# Altium footprint library Cty1.PcbLib: 870 footprints (part 43 of 55)
Each footprint in its own frame and in the unit in brackets; x right, y up, seen from the top. Pads: shape width x height; smd on the part's side, far side on the other; paste and mask are expansions set on the pad; w line width, h text height; cw(c..) or ccw(c..) is an arc to the next point about the centre after c.
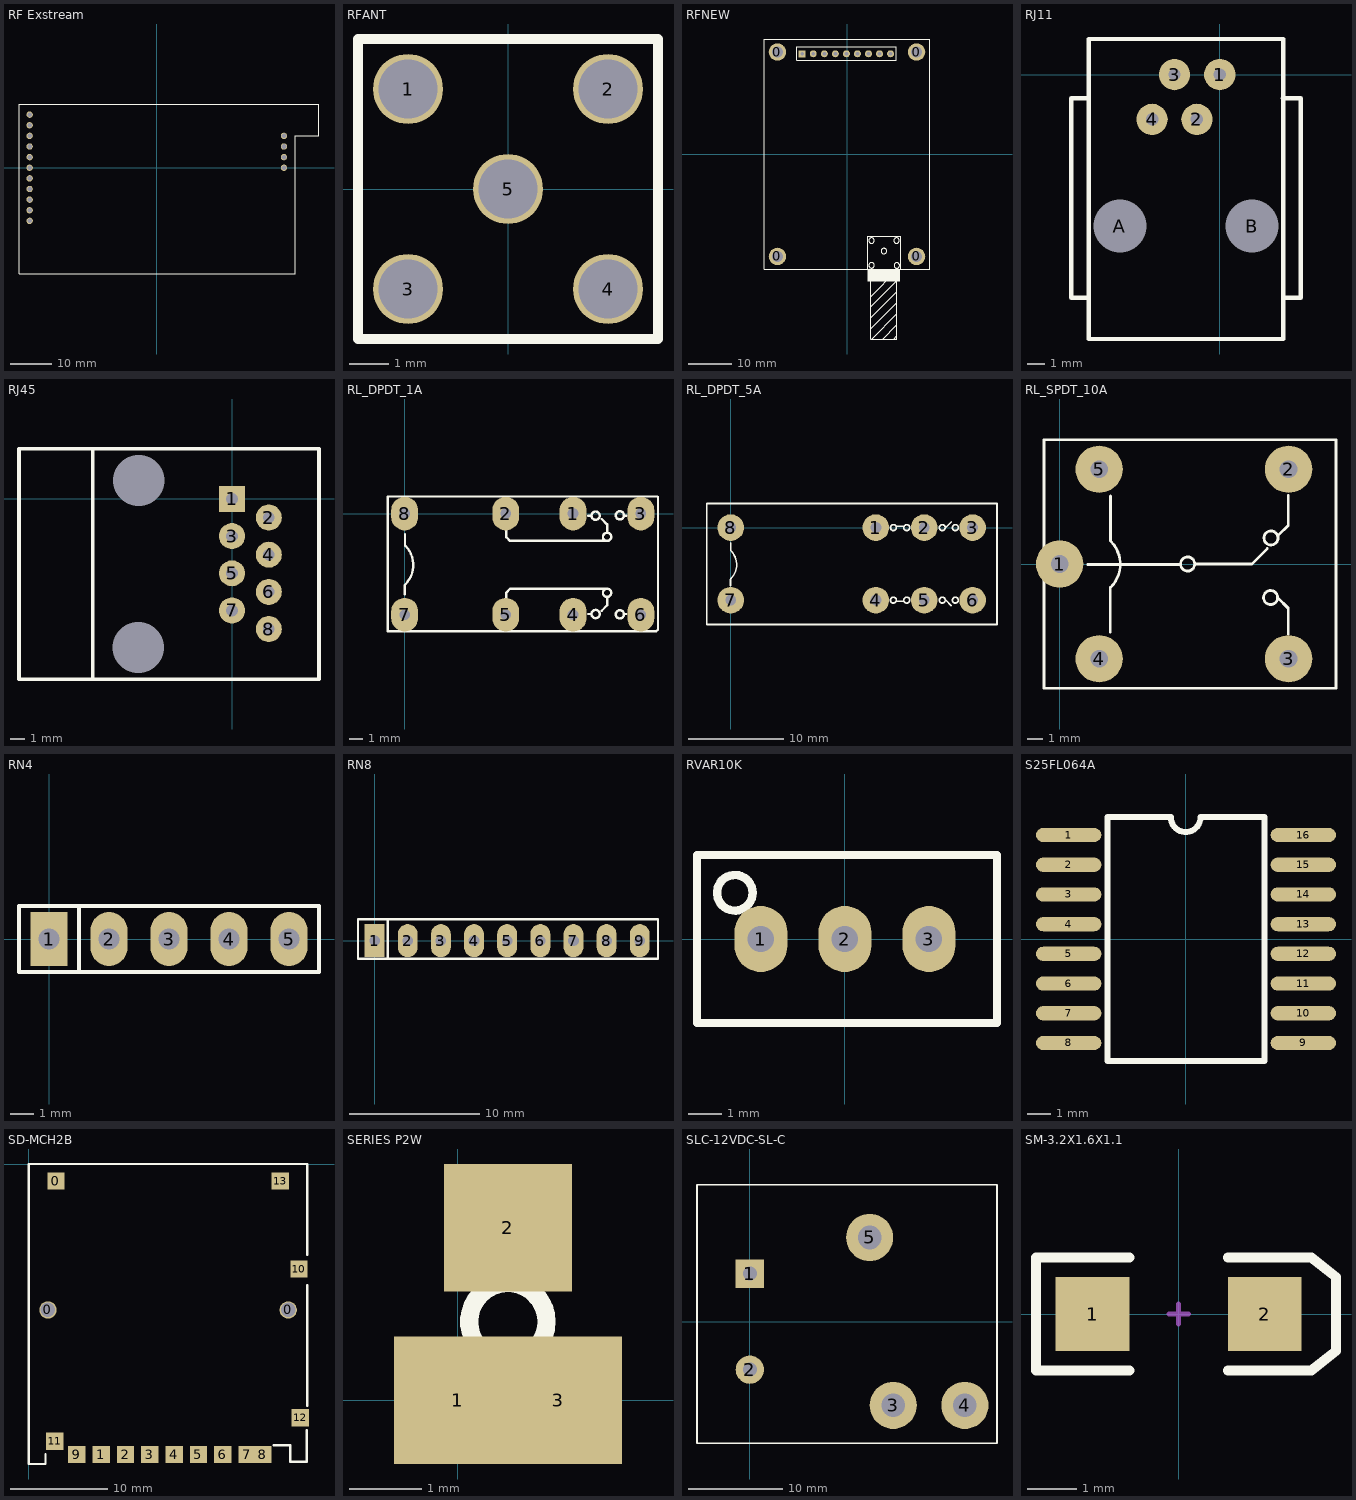
[diagram p42: the footprints below, top view; thin cyan lines are the x and y axes]

## RF Exstream [mil] "Modul RF maxstream 900MHz"
pads (15):
  round 60 hole 43.31: 1(-1197.5,500) 2(-1197.5,400) 3(-1197.5,300) 4(-1197.5,200) 5(-1197.5,100) 6(-1197.5,0) 7(-1197.5,-100) 8(-1197.5,-200) 9(-1197.5,-300) 10(-1197.5,-400) 11(-1197.5,-500) 12(1197.5,300) 13(1197.5,200) 14(1197.5,100) 15(1197.5,0)
Top Overlay:
  lines w10: -1297.5,-1000 -1297.5,600 1527.5,600 1527.5,300 1302.5,300 1302.5,-1000 -1297.5,-1000

## RFANT [mil]
pads (5):
  round 70 hole 59.06 unplated: 1(-100,100) 2(100,100) 3(-100,-100) 4(100,-100) 5(0,0)
Top Overlay:
  lines w10: -150,-150 -150,100 -150,150 150,150 150,-150 -150,-150

## RFNEW [mm] "Module RF"
height 10
pads (13):
  round 4 hole 2.5: 0(-16,-23.5) 0(-16,23.5) 0(16,-23.5) 0(16,23.5)
  rect 1.6x1.6 hole 0.9: 1(-10.3,23.1)
  round 1.6 hole 0.9: 2(-7.76,23.1) 3(-5.22,23.1) 4(-2.68,23.1) 5(-0.14,23.1) 6(2.4,23.1) 7(4.94,23.1) 8(7.48,23.1) 9(10.02,23.1)
Top Overlay:
  circle w0.254: c8.497,-22.275 r0.635
  circle w0.254: c5.652,-19.862 r0.635
  circle w0.254: c11.392,-19.862 r0.635
  circle w0.254: c11.455,-25.586 r0.635
  circle w0.254: c5.652,-25.551 r0.635
  rectangle: 4.724,-29.318 12.192,-26.492
  lines w0.2: 5.5,-40.171 11.5,-34.171 ; 5.5,-37.631 11.5,-31.631 ; 5.5,-29.091 8.04,-26.551 ; 5.506,-35.085 11.5,-29.091 ; 5.582,-32.621 11.5,-26.703 ; 5.785,-42.426 11.5,-36.711 ; 8.251,-42.5 11.5,-39.251 ; 10.791,-42.5 11.5,-41.791 ; -11.57,21.59 11.29,21.59 11.29,24.765 -11.57,24.765 -11.57,21.59
  lines w0.254: 5.5,-26.5 5.5,-42.5 11.5,-42.5 11.5,-26.5 ; -19,-26.5 19,-26.5 19,26.5 -19,26.5 -19,-26.5 ; 4.724,-26.5 4.724,-20.15 4.724,-18.88 12.344,-18.88 12.344,-26.5 4.724,-26.5

## RJ11 [mil]
pads (6):
  round 70 hole 27.56 unplated: 1(0,0) 2(-51,-100) 3(-101,0) 4(-151,-100)
  round 70 hole 118.11 unplated: A(-223,-337.7) B(72.28,-337.7)
Top Overlay:
  lines w10: -291.9,-497.7 -331.27,-497.7 -331.27,-52.7 -291.9,-52.7 ; 140,-52.7 180.54,-52.7 180.54,-497.7 141.17,-497.7 ; -291.9,-589.55 -291.9,79.3 141.17,79.3 141.17,-589.55 -291.9,-589.55

## RJ45 [mil]
pads (10):
  rect 70x70 hole 31.5 unplated: 1(0,0)
  round 70 hole 31.5 unplated: 2(99,-50) 3(0,-100) 4(99,-150) 5(0,-200) 6(99,-250) 7(0,-300) 8(99,-350)
  round 70 hole 137.8 unplated: ""(-252,-400) ""(-251,50)
Top Overlay:
  lines w10: -375,-485.04 -375,135.04 -306,135.04 ; -573.05,-485.04 -510,-485.04 -408,-485.04 50,-485.04 148,-485.04 234.04,-485.04 234.04,135.04 148.37,135.03 50,135.04 -414,135.04 -509,135.04 -573.05,135.04 -573.05,-485.04

## RL_DPDT_1A [mil] "Reley DPDT, 8 pin, 1A, W400mil, L800mil,H 300mil"
height 300
pads (8):
  oval 80x100 hole 32: 1(500,0) 2(300,0) 3(701,0) 4(500,-300) 5(300,-300) 6(701,-300) 7(0,-300) 8(0,0)
Top Overlay:
  circle w7: c638.76,-5 r12.24
  circle w7: c566.76,-6 r12.24
  circle w7: c600.76,-69 r12.24
  circle w7: c600.76,-235 r12.24
  circle w7: c566.76,-298 r12.24
  circle w7: c638.76,-299 r12.24
  lines w7: 0,-239 0,-212 ; 1,-211 ccw(c-56.5,-152.5) 2,-95 ; 1,-94 1,-61 ; 302,-255 302,-234 313,-223 599,-223 ; 302,-42 302,-70 313,-81 599,-81 ; 544,-298 552,-298 ; 544,-6 552,-6 ; 585,-288 601,-272 601,-249 ; 585,-16 601,-32 601,-55 ; 653,-298 658,-298 ; 653,-6 658,-6 ; -50,-349 747,-349 752,-344 752,49 750,51 -50,51 -50,-349
3D body "SW3dPS-DSY2Y.STEP": height 484.25, standoff -118.11, extent -59.45,-340 759.45,45.83

## RL_DPDT_5A [mil] "Reley DPDT, 8 pin, 5A, W500mil, L1100mil,H 950mil"
height 300
pads (8):
  round 110 hole 45: 1(600,0) 2(800,0) 3(1000,0) 4(600,-300) 5(800,-300) 6(1000,-300) 7(0,-300) 8(0,0)
Top Overlay:
  circle w7: c928.76,0 r12.24
  circle w7: c874.76,0 r12.24
  circle w7: c727.76,0 r12.24
  circle w7: c672.76,0 r12.24
  circle w7: c672.76,-300 r12.24
  circle w7: c727.76,-300 r12.24
  circle w7: c874.76,-300 r12.24
  circle w7: c928.76,-300 r12.24
  lines w7: -1,-240 -1,-213 ; 0,-212 ccw(c-57.5,-153.5) 1,-96 ; 0,-95 0,-62 ; 687,-305 716,-305 ; 687,5 716,5 ; 888,-299 912,-323 ; 888,-1 912,23 ; -99,-401 -99,100 1101,100 1101,-401 -99,-401

## RL_SPDT_10A [mil] "Relay SPDT, 5 pin, 10A,W 650mil, L 800mil, H 800mil"
height 800
pads (5):
  round 120 hole 45: 1(0,0) 2(580,240) 3(580,-240) 4(100,-240) 5(100,240)
Top Overlay:
  circle w7: c534.2,-85 r17.8
  circle w7: c535.2,66 r17.8
  circle w7: c324.2,0 r17.8
  lines w7: 71,-1 304,-1 ; 128,-173 128,-60 ; 129,-59 ccw(c71.5,-0.5) 130,57 ; 129,58 129,172 ; 344,0 487,0 526,39 ; 552,-85 579,-112 579,-178 ; 553,72 579,98 579,174 ; -40,-315 -40,315 700,315 700,-315 -40,-315
3D body "User Library-RELAY  12MMx12MM SQUARE-1.STEP": height 590.55, standoff -78.74, extent -98.42,-314.96 688.98,314.96

## RN4 [mil] "R SIP4, 5 Pin"
height 200
pads (5):
  rect 62x90 hole 35: 1(0,0)
  oval 62x90 hole 35: 2(100,0) 3(200,0) 4(300,0) 5(400,0)
Top Overlay:
  lines w7: 50,-55 50,55 ; -50,-55 -50,55 450,55 450,-55 -50,-55

## RN8 [mil] "R SIP8, 9 Pin"
height 200
pads (9):
  rect 60x100 hole 32: 1(0,0)
  oval 60x100 hole 32: 2(100,0) 3(200,0) 4(300,0) 5(400,0) 6(500,0) 7(600,0) 8(700,0) 9(800,0)
Top Overlay:
  lines w7: 40,-55 40,65 ; -50,-55 855,-55 855,65 -50,65 -50,-55
3D body "SW3dPS-Resistor Networks-1.STEP": height 259.29, standoff -75.35, extent -42.91,-44.21 842.91,5

## RVAR10K [mm] "Bien tro vi chinh"
pads (3):
  oval 1.6x2 hole 0.8: 1(-2.54,0) 2(0,0) 3(2.54,0)
Top Overlay:
  circle w0.254: c-3.327,1.397 r0.539
  lines w0.254: -4.47,-2.54 -4.47,2.54 4.597,2.54 4.597,-2.54 -4.47,-2.54

## S25FL064A [mil]
pads (16):
  oval 110x24 smd: 1(-197.5,175) 2(-197.5,125) 3(-197.5,75) 4(-197.5,25) 5(-197.5,-25) 6(-197.5,-75) 7(-197.5,-125) 8(-197.5,-175) 9(197.5,-175) 10(197.5,-125) 11(197.5,-75) 12(197.5,-25) 13(197.5,25) 14(197.5,75) 15(197.5,125) 16(197.5,175)
Top Overlay:
  lines w10: -132.5,-205 132.5,-205 132.5,205 24.5,205 cw(c-0.5,205) -25.5,205 -132.5,205 -132.5,-205

## SD-MCH2B [mil]
pads (16):
  round 70 hole 59.05 unplated: 0(76.77,-590.55) 0(1049.21,-590.55)
  rect 70x70 smd: 0(109.25,-68.9) 1(292.32,-1175.55) 2(390.75,-1175.55) 3(489.17,-1175.55) 4(587.6,-1175.55) 5(686.02,-1175.55) 6(784.45,-1175.55) 7(882.87,-1175.55) 8(946.85,-1175.55) 9(193.9,-1175.55) 10(1092.52,-425.2) 11(104.33,-1122.05) 12(1098.43,-1026.38) 13(1016.73,-68.9)
Top Overlay:
  lines w10: 66.93,-1174.07 66.93,-1213.98 0,-1213.98 0,-698.98 0,0 1125.98,0 1125.98,-367.54 ; 990.92,-1138.62 1057.09,-1138.62 1057.09,-1205.55 1124.02,-1205.55 1124.02,-1077.57 ; 1125.98,-978.57 1125.98,-690.55 1125.98,-490.53

## SERIES P2W [mil]
pads (3):
  rect 70x70 smd: 1(0,0) 2(27.56,94.49) 3(55.12,0)
Top Overlay:
  circle w10: c27.46,43 r21.2

## SLC-12VDC-SL-C [mm] "RELAY"
height 28
pads (5):
  rect 3x3 hole 1.5: 1(0,5.08)
  round 3 hole 1.5: 2(0,-5.1)
  round 5 hole 2.5: 3(15.2,-8.89) 4(22.8,-8.89) 5(12.7,8.91)
Top Overlay:
  lines w0.2: 26.15,-12.9 -5.6,-12.9 ; 26.2,-12.9 26.2,14.5 -5.6,14.5 ; -5.6,-12.9 -5.6,14.5 ; -5.6,-12.9 -5.6,14.5

## SM-3.2X1.6X1.1 [mm] "SMT LED; 2 Flat Leads"
height 1.2
pads (2):
  rect 1.5x1.5 smd: 1(-1.75,0) 2(1.75,0)
Top Overlay:
  lines w0.2: -1,-1.15 -2.9,-1.15 -2.9,1.15 -1,1.15 ; 1,-1.15 2.7,-1.15 3.2,-0.75 3.2,0.75 2.7,1.15 1,1.15
Mechanical 1:
  lines w0.1: -0.2,0 0.2,0 ; 0,-0.2 0,0.2
3D body "SW3DPS-RESISTOR 1206-DEFAULT.STEP": height 0.53, standoff -0.03, extent -1.473,-0.889 1.727,0.771